# Altium footprint library TO系列封装.PcbLib: 129 footprints (part 8 of 9)
Each footprint in its own frame and in the unit in brackets; x right, y up, seen from the top. Pads: shape width x height; smd on the part's side, far side on the other; paste and mask are expansions set on the pad; w line width, h text height; cw(c..) or ccw(c..) is an arc to the next point about the centre after c.
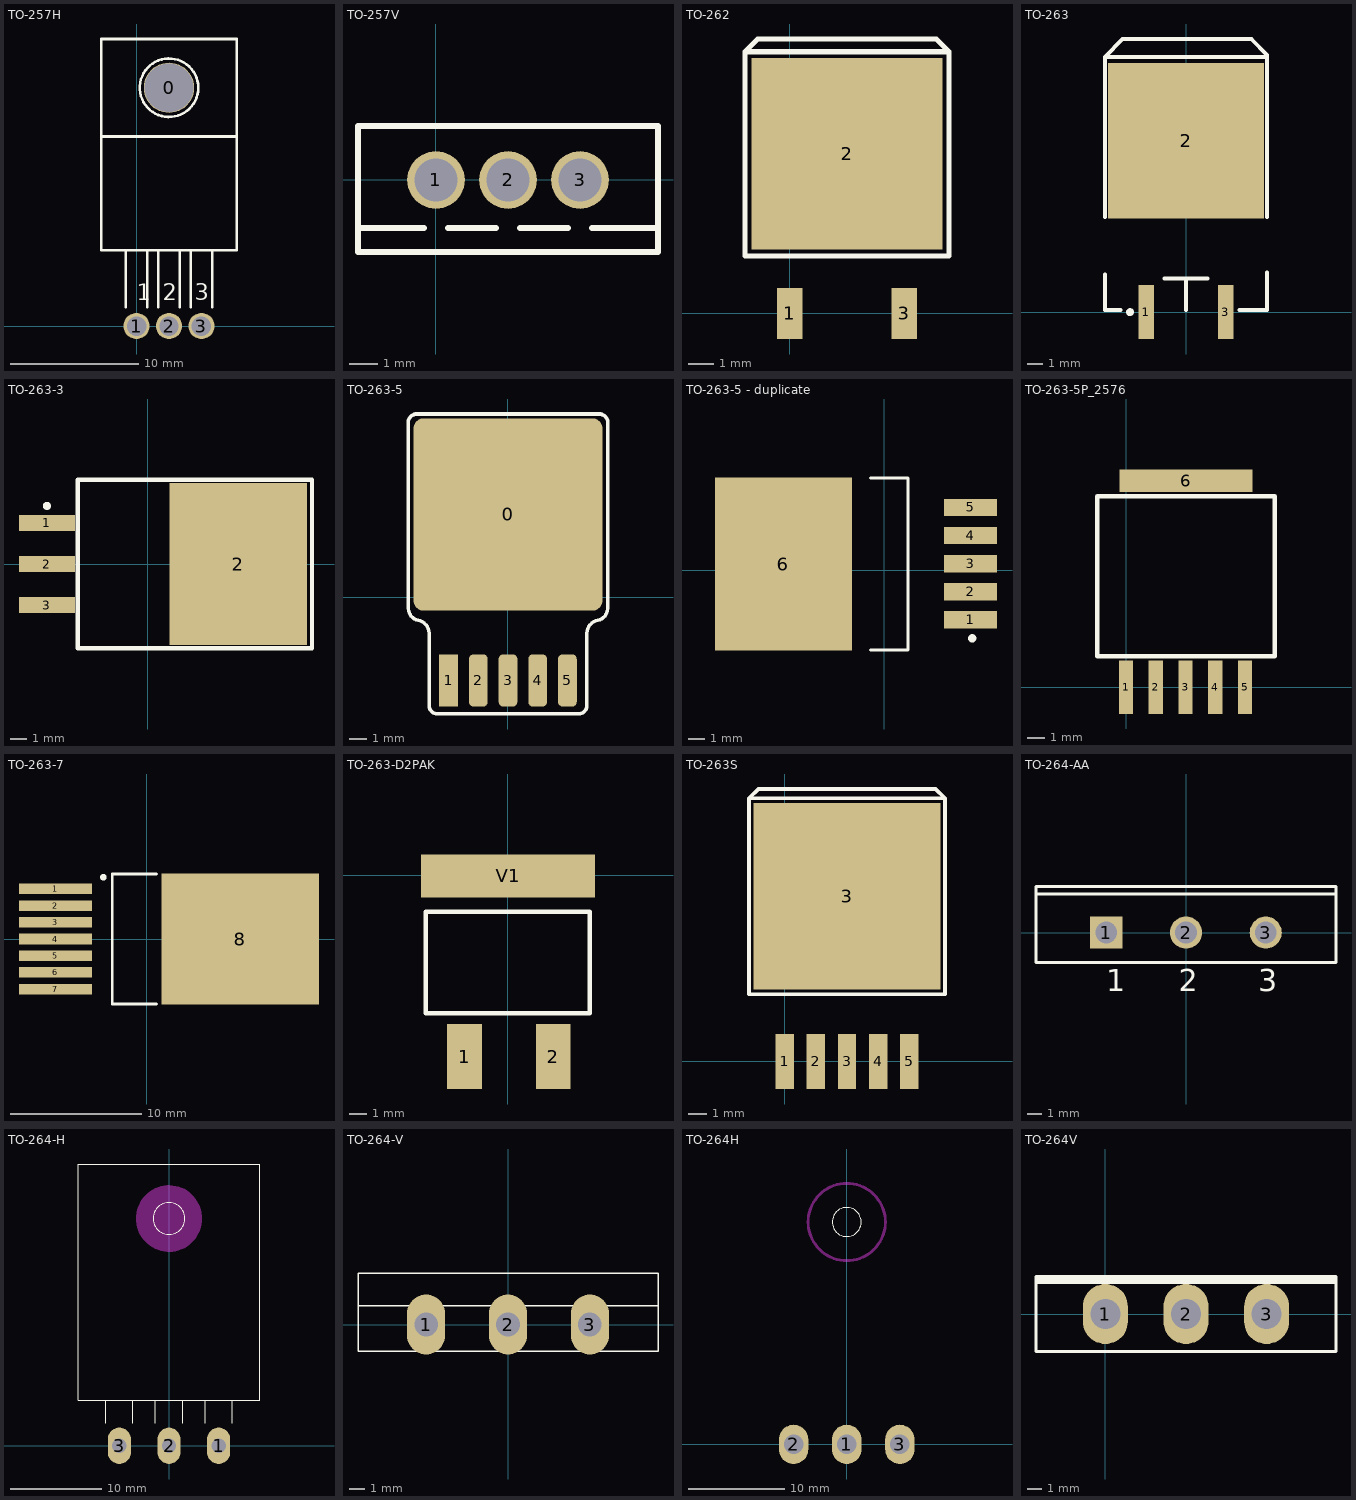
[diagram p7: the footprints below, top view; thin cyan lines are the x and y axes]

## TO-257H [mil]
pads (4):
  round 155 hole 150: 0(100,733.33)
  round 80 hole 60: 1(0,0) 2(100,0) 3(200,0)
Top Overlay:
  circle w8: c100,733.33 r90
  lines w7.87: -108.33,583.33 308.33,583.33 ; -33.33,58.33 -33.33,233.33 ; 33.33,58.33 33.33,233.33 ; 66.67,58.33 66.67,233.33 ; 133.33,58.33 133.33,233.33 ; 166.67,58.33 166.67,233.33 ; 233.33,58.33 233.33,233.33 ; -108.33,233.33 -108.33,883.33 308.33,883.33 308.33,233.33 -108.33,233.33
  text "3" at 180,80 h50
  text "2" at 80,80 h50
  text "1" at 0,80 h50

## TO-257V [mil]
pads (3):
  round 80 hole 60: 1(0,0) 2(100,0) 3(200,0)
Top Overlay:
  lines w7.87: -108.33,-66.67 -16.67,-66.67 ; 16.67,-66.67 83.33,-66.67 ; 116.67,-66.67 183.33,-66.67 ; 216.67,-66.67 308.33,-66.67 ; -108.33,-100 -108.33,75 308.33,75 308.33,-100 -108.33,-100

## TO-262 [mil]
pads (3):
  rect 40x80 smd: 1(0,0) 3(180,0)
  rect 300x300 smd: 2(90,250)
Top Overlay:
  lines w8: -70,410 -50,430 230,430 250,410 ; -70,410 -70,90 250,90 250,410 ; -70,410 250,410

## TO-263 [mm]
pads (3):
  rect 1x3.45 smd: 1(-2.54,0) 3(2.54,0)
  rect 10x10 smd: 2(0,11)
Top Overlay:
  circle w0.25: c-3.59,0 r0.125
  lines w0.254: -5.207,2.413 -5.207,0.127 -4.191,0.127 ; -5.207,6.096 -5.207,16.385 ; -1.397,2.159 1.397,2.159 ; 0,0.127 0,2.159 ; 3.429,0.127 5.207,0.127 5.207,2.54 ; 5.207,6.096 5.207,16.385 -5.207,16.385 ; 5.207,16.51 4.189,17.528 -4.064,17.528 -5.207,16.385
3D body "SW3dPS-DPAK.STEP": height 4.88, standoff -0.13, extent -5.08,-0.653 5.08,14.611

## TO-263-3 [mm] "D2PAK936"
height 4.5
pads (4):
  rect 3.45x1 smd: 1(-6.225,2.54) 2(-6.225,0) 3(-6.225,-2.54)
  rect 8.5x10 smd: 2(5.588,0)
Top Overlay:
  circle w0.25: c-6.225,3.59 r0.125
  lines w0.254: -4.318,-5.207 10.16,-5.207 10.16,5.207 -4.318,5.207 -4.318,-5.207
3D body "SW3dPS-TO263-3.STEP": height 4.88, standoff 0.08, extent -6.819,-5.054 8.851,4.946

## TO-263-5 [mm]
pads (6):
  rrect10% 10.8x11 smd: 0(0,4.75)
  rect 1.07x3 smd: 1(-3.4,-4.75)
  rrect50% 1.07x3 smd: 2(-1.7,-4.75) 3(0,-4.75) 4(1.7,-4.75) 5(3.4,-4.75)
Top Overlay:
  lines w0.2: -4.512,-6.122 ccw(c-4.028,-6.181) -4.125,-6.659 ; 4.125,-6.659 ccw(c4.028,-6.181) 4.512,-6.122
  lines w0.203: -5.7,10.05 -5.7,-0.53 ccw(c-5.005,-0.615) -5.145,-1.301 cw(c-5.306,-2.084) -4.512,-2.181 -4.512,-6.122 ; -5.7,10.109 cw(c-5.222,10.011) -5.299,10.493 ; -5.3,10.5 5.3,10.5 ; -4.125,-6.659 4.125,-6.659 ; 4.512,-6.122 4.512,-2.181 cw(c5.306,-2.084) 5.145,-1.301 ccw(c5.005,-0.615) 5.7,-0.53 5.7,10.05 ; 5.299,10.493 cw(c5.222,10.011) 5.7,10.109
3D body "SW3dPS-LTC DD-PAK.STEP": height 4.48, standoff 0, extent -5.137,-4.801 5.087,9.55

## TO-263-5 - duplicate [mm]
pads (6):
  rect 3.2x1.05 smd: 1(5.207,-2.997) 2(5.207,-1.297) 3(5.207,0.403) 4(5.207,2.103) 5(5.207,3.803)
  rect 8.3x10.45 smd: 6(-6.117,0.381)
Top Overlay:
  circle w0.25: c5.309,-4.115 r0.125
  lines w0.2: -0.83,-4.819 1.42,-4.819 1.42,5.581 -0.83,5.581
3D body "TO263-5.STEP": height 4.78, standoff -0.02, extent -9.537,-4.644 6.133,5.356

## TO-263-5P_2576 [mil]
pads (6):
  rect 32x120 smd: 1(0,0) 2(67,0) 3(134,0) 4(201,0) 5(268,0)
  rect 300x50 smd: 6(135,465)
Top Overlay:
  lines w10: -65,70 -65,430 335,430 335,70 -65,70

## TO-263-7 [mm] "TO, 8-Pads,7970"
height 4.4
pads (8):
  rect 5.55x0.8 smd: 1(-6.943,3.81) 2(-6.943,2.54) 3(-6.943,1.27) 4(-6.943,0) 5(-6.943,-1.27) 6(-6.943,-2.54) 7(-6.943,-3.81)
  rect 12x10 smd: 8(7.112,0)
Top Overlay:
  circle w0.25: c-3.3,4.699 r0.125
  lines w0.2: 0.75,-4.95 -2.625,-4.95 -2.625,4.95 0.75,4.95

## TO-263-D2PAK [mil]
pads (3):
  rect 80x150 smd: 1(-100,-420) 2(105,-420)
  rect 402x100 smd: V1(0.55,-1.97)
Top Overlay:
  lines w10: -190,-320 190,-320 190,-85 -190,-85 -190,-320

## TO-263S [mm]
pads (6):
  rect 1x3 smd: 1(0,0) 2(1.7,0) 3(3.4,0) 4(5.1,0) 5(6.8,0)
  rect 10.16x10.16 smd: 3(3.4,9)
Top Overlay:
  lines w0.203: -1.934,14.334 -1.426,14.842 8.226,14.842 8.734,14.334 ; -1.934,14.334 -1.934,3.666 8.734,3.666 8.734,14.334 ; -1.934,14.334 8.734,14.334
3D body "User Library-TO-263-5.STEP": height 4.56, standoff 0, extent -1.778,-0.807 8.382,13.208

## TO-264-AA [mm] "SIP with Mounting Hole; 3 Leads; Body 26 x 20 x 5 mm (typ); Pitch 5.45 mm"
height 29
pads (3):
  rect 2.2x2.2 hole 1.5: 1(-5.45,0)
  round 2.2 hole 1.5: 2(0,0) 3(5.45,0)
Top Overlay:
  lines w0.2: -10.25,2.65 10.25,2.65 ; -10.25,-2.05 10.25,-2.05 10.25,3.15 -10.25,3.15 -10.25,-2.05
  text "1" at -5.45,-4.025 h1.5
  text "2" at -0.508,-4.025 h1.5
  text "3" at 4.942,-4.025 h1.5
3D body "to264.STEP": height 34, standoff -5, extent -10.025,-2.712 9.975,2.388

## TO-264-H [mil]
pads (3):
  oval 100x157.48 hole 62: 1(215,0) 2(0,0) 3(-215,0)
Top Overlay:
  circle w3.94: c0,984.25 r68.9
  lines w3.94: -274.06,98.43 -274.06,196.85 ; -155.94,98.43 -155.94,196.85 ; -59.06,98.43 -59.06,196.85 ; 59.06,98.43 59.06,196.85 ; 155.94,98.43 155.94,196.85 ; 274.06,98.43 274.06,196.85 ; -393.7,196.85 -393.7,1220.47 393.7,1220.47 393.7,196.85 -393.7,196.85
Keep-Out Layer:
  circle w3.94: c0,984.25 r141.73
  board cut-out: 141.73,984.48 141.73,993.74 139.31,1012.11 134.52,1030 127.43,1047.11 118.17,1063.16 106.89,1077.85 93.79,1090.95 79.1,1102.23 63.06,1111.49 45.94,1118.58 28.05,1123.37 9.69,1125.79 0.42,1125.79 -0.39,1125.79 -9.65,1125.79 -28.02,1123.37 -45.92,1118.57 -63.04,1111.48 -79.08,1102.22 -93.78,1090.94 -106.88,1077.84 -118.16,1063.14 -127.42,1047.1 -134.51,1029.98 -139.31,1012.08 -141.73,993.71 -141.73,984.45 -141.73,975.16 -139.3,956.74 -134.49,938.79 -127.38,921.63 -118.09,905.54 -106.78,890.8 -93.65,877.66 -78.91,866.35 -62.82,857.06 -45.65,849.95 -27.71,845.14 -9.29,842.72 0,842.72 0.79,842.72 10.03,842.72 28.35,845.13 46.19,849.91 63.26,856.98 79.26,866.22 93.92,877.46 106.98,890.53 118.23,905.19 127.47,921.19 134.54,938.25 139.32,956.1 141.73,974.42 141.73,983.65
3D body "User Library-to264.STEP": height 393.7, standoff -318.9, extent -403.55,-9.02 403.54,1222.44

## TO-264-V [mil]
pads (3):
  oval 100x157.48 hole 62: 1(-215,0) 2(0,0) 3(215,0)
Top Overlay:
  lines w3.94: -393.7,49.21 393.7,49.21 ; -393.7,-70.87 -393.7,133.86 393.7,133.86 393.7,-70.87 -393.7,-70.87
3D body "User Library-to264.STEP": height 1170.26, standoff -639.94, extent -403.54,-70.87 403.54,133.86

## TO-264H [mil]
pads (3):
  oval 120x160 hole 80: 1(0,0) 2(-216.54,0) 3(216.53,0)
Top Overlay:
  circle w3.94: c0,905.51 r59.05
Bottom Overlay:
  lines w5.91: -394.7,814.39 ccw(c-392.88,893.11) -393.7,971.85 ; -393.79,468.75 ccw(c-392.88,508.11) -393.29,547.48 ; -390.08,123.15 -346.54,166.69 ; -389.37,1137.64 -346.54,1094.8 ; -345.43,828.82 -345.43,166.69 352.17,166.69 352.17,825.71 ; -345.47,958.86 -345.47,1108.27 -344.92,1108.82 353.58,1108.82 353.58,965.51 ; 23.39,227.74 cw(c3.7,227.74) 23.39,227.83 ; 345.2,166.69 387.32,124.57 ; 353.62,1101.81 392.24,1140.43 ; 395.34,547.48 ccw(c394.93,508.11) 395.84,468.75 ; 395.75,971.85 ccw(c394.93,893.11) 396.75,814.39
  lines w11.81: -216.54,118.11 -216.38,89.96 ; -39.37,905.51 39.37,905.51 ; 0,118.11 0.2,91.89 ; 0,866.14 0,944.88 ; 216.53,118.11 216.93,87.68 ; -393.7,118.11 -393.7,1141.73 ; -393.7,118.11 393.7,118.11 393.7,1141.73 -393.7,1141.73 ; -393.7,118.11 -393.7,1141.73
Keep-Out Layer:
  circle w11.81: c0,905.51 r157.48
3D body "User Library-TO-264-H.STEP": height 358.27, standoff -354.33, extent -397.09,-5.73 410,1225.73

## TO-264V [mil]
pads (3):
  oval 120x160 hole 80: 1(0,0) 2(215,0) 3(430,0)
Top Overlay:
  lines w7.87: -185,83.33 615,83.33 ; -185,-100 -185,100 615,100 615,-100 -185,-100
  lines w8: -185,90 615,90 ; -185,95 615,95
3D body "User Library-to264.STEP": height 1327.74, standoff -482.46, extent -193.54,-100 613.54,104.72